# Altium footprint library Elettronica FM.PcbLib: 387 footprints (part 23 of 25)
Each footprint in its own frame and in the unit in brackets; x right, y up, seen from the top. Pads: shape width x height; smd on the part's side, far side on the other; paste and mask are expansions set on the pad; w line width, h text height; cw(c..) or ccw(c..) is an arc to the next point about the centre after c.
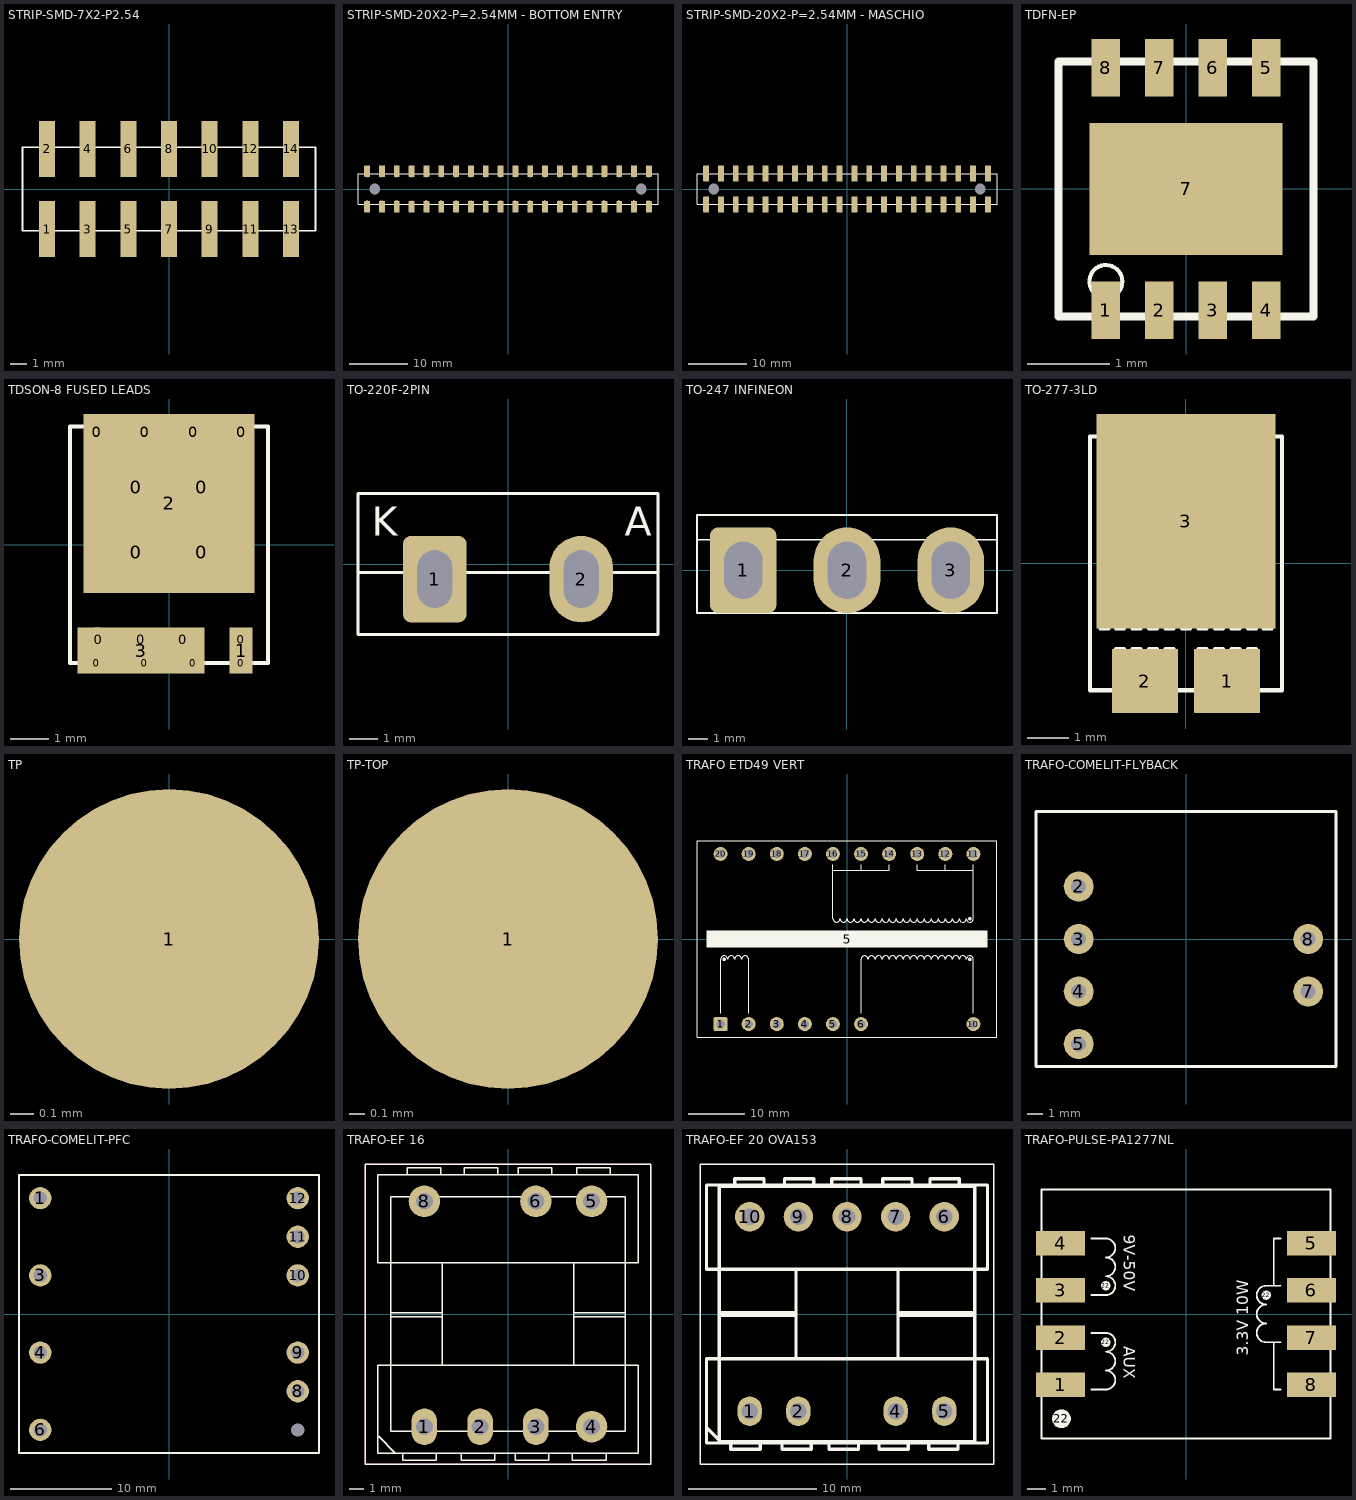
[diagram p22: the footprints below, top view; thin cyan lines are the x and y axes]

## STRIP-SMD-7X2-P2.54 [mm]
pads (14):
  rect 1x3.5 smd: 1(-7.62,-2.5) 2(-7.62,2.5) 3(-5.08,-2.5) 4(-5.08,2.5) 5(-2.54,-2.5) 6(-2.54,2.5) 7(0,-2.5) 8(0,2.5) 9(2.54,-2.5) 10(2.54,2.5) 11(5.08,-2.5) 12(5.08,2.5) 13(7.62,-2.5) 14(7.62,2.5)
Top Overlay:
  lines w0.1: -9.15,-2.6 9.15,-2.6 9.15,2.6 -9.15,2.6 -9.15,-2.6
3D body "Samtec-TSM-103-02-T-DV.step": height 11.94, standoff 0, extent -8.9,-3.683 -1.28,3.683
3D body "Samtec-TSM-103-02-T-DV.step": height 11.94, standoff 0, extent -3.82,-3.683 3.8,3.683
3D body "Samtec-TSM-103-02-T-DV.step": height 11.94, standoff 0, extent 1.26,-3.683 8.88,3.683

## STRIP-SMD-20X2-P=2.54MM - BOTTOM ENTRY [mm]
height 16.6
pads (42):
  round 0 hole 1.8 unplated: 0(-22.86,0) 0(22.86,0)
  rrect25% 1x2 smd: 1(-24.13,-3.05) 2(-24.13,3.05) 3(-21.59,-3.05) 4(-21.59,3.05) 5(-19.05,-3.05) 6(-19.05,3.05) 7(-16.51,-3.05) 8(-16.51,3.05) 9(-13.97,-3.05) 10(-13.97,3.05) 11(-11.43,-3.05) 12(-11.43,3.05) 13(-8.89,-3.05) 14(-8.89,3.05) 15(-6.35,-3.05) 16(-6.35,3.05) 17(-3.81,-3.05) 18(-3.81,3.05) 19(-1.27,-3.05) 20(-1.27,3.05) 21(1.27,-3.05) 22(1.27,3.05) 23(3.81,-3.05) 24(3.81,3.05) 25(6.35,-3.05) 26(6.35,3.05) 27(8.89,-3.05) 28(8.89,3.05) 29(11.43,-3.05) 30(11.43,3.05) 31(13.97,-3.05) 32(13.97,3.05) 33(16.51,-3.05) 34(16.51,3.05) 35(19.05,-3.05) 36(19.05,3.05) 37(21.59,-3.05) 38(21.59,3.05) 39(24.13,-3.05) 40(24.13,3.05)
Top Overlay:
  lines w0.1: -25.7,-2.65 25.7,-2.65 25.7,2.65 -25.7,2.65 -25.7,-2.65
  text "7" at -16.675,-1.95 h0.3
  text "8" at -16.675,2.15 h0.3
  text "6" at -19.215,2.15 h0.3
  text "4" at -21.765,2.15 h0.3
  text "2" at -24.29,2.15 h0.3
  text "5" at -19.215,-1.95 h0.3
  text "3" at -21.765,-1.95 h0.3
  text "1" at -24.29,-1.95 h0.3
  text "9" at -14.135,-1.95 h0.3
  text "11" at -11.6,-1.95 h0.3
  text "13" at -9.06,-1.95 h0.3
  text "15" at -6.52,-1.95 h0.3
  text "17" at -3.98,-1.95 h0.3
  text "19" at -1.44,-1.95 h0.3
  text "21" at 1.1,-1.95 h0.3
  text "23" at 3.64,-1.95 h0.3
  text "25" at 6.18,-1.95 h0.3
  text "27" at 8.72,-1.95 h0.3
  text "29" at 11.26,-1.95 h0.3
  text "31" at 13.8,-1.95 h0.3
  text "33" at 16.34,-1.95 h0.3
  text "35" at 18.88,-1.95 h0.3
  text "37" at 21.42,-1.95 h0.3
  text "39" at 23.96,-1.95 h0.3
  text "10" at -14.135,2.4 h0.3
  text "12" at -11.595,2.4 h0.3
  text "14" at -9.055,2.4 h0.3
  text "22" at 1.105,2.45 h0.3
  text "20" at -1.435,2.45 h0.3
  text "18" at -3.975,2.4 h0.3
  text "16" at -6.515,2.4 h0.3
  text "30" at 11.265,2.45 h0.3
  text "28" at 8.725,2.45 h0.3
  text "26" at 6.185,2.45 h0.3
  text "24" at 3.645,2.45 h0.3
  text "38" at 21.425,2.45 h0.3
  text "36" at 18.885,2.45 h0.3
  text "34" at 16.345,2.45 h0.3
  text "32" at 13.805,2.45 h0.3
  text "40" at 23.965,2.45 h0.3
3D body: height 7.4, standoff 0, extent -25.7,-2.65 25.7,2.65

## STRIP-SMD-20X2-P=2.54MM - MASCHIO [mm]
height 16.6
pads (42):
  round 0 hole 1.8 unplated: 0(-22.86,0) 0(22.86,0)
  rrect25% 1x2.8 smd: 1(-24.13,-2.65) 2(-24.13,2.65) 3(-21.59,-2.65) 4(-21.59,2.65) 5(-19.05,-2.65) 6(-19.05,2.65) 7(-16.51,-2.65) 8(-16.51,2.65) 9(-13.97,-2.65) 10(-13.97,2.65) 11(-11.43,-2.65) 12(-11.43,2.65) 13(-8.89,-2.65) 14(-8.89,2.65) 15(-6.35,-2.65) 16(-6.35,2.65) 17(-3.81,-2.65) 18(-3.81,2.65) 19(-1.27,-2.65) 20(-1.27,2.65) 21(1.27,-2.65) 22(1.27,2.65) 23(3.81,-2.65) 24(3.81,2.65) 25(6.35,-2.65) 26(6.35,2.65) 27(8.89,-2.65) 28(8.89,2.65) 29(11.43,-2.65) 30(11.43,2.65) 31(13.97,-2.65) 32(13.97,2.65) 33(16.51,-2.65) 34(16.51,2.65) 35(19.05,-2.65) 36(19.05,2.65) 37(21.59,-2.65) 38(21.59,2.65) 39(24.13,-2.65) 40(24.13,2.65)
Top Overlay:
  lines w0.1: -25.7,-2.65 -25.7,2.65 25.7,2.65 25.7,-2.65 -25.7,-2.65
  text "40" at 23.965,2.45 h0.3
  text "32" at 13.805,2.45 h0.3
  text "34" at 16.345,2.45 h0.3
  text "36" at 18.885,2.45 h0.3
  text "38" at 21.425,2.45 h0.3
  text "24" at 3.645,2.45 h0.3
  text "26" at 6.185,2.45 h0.3
  text "28" at 8.725,2.45 h0.3
  text "30" at 11.265,2.45 h0.3
  text "16" at -6.515,2.4 h0.3
  text "18" at -3.975,2.4 h0.3
  text "20" at -1.435,2.45 h0.3
  text "22" at 1.105,2.45 h0.3
  text "14" at -9.055,2.4 h0.3
  text "12" at -11.595,2.4 h0.3
  text "10" at -14.135,2.4 h0.3
  text "39" at 23.96,-1.95 h0.3
  text "37" at 21.42,-1.95 h0.3
  text "35" at 18.88,-1.95 h0.3
  text "33" at 16.34,-1.95 h0.3
  text "31" at 13.8,-1.95 h0.3
  text "29" at 11.26,-1.95 h0.3
  text "27" at 8.72,-1.95 h0.3
  text "25" at 6.18,-1.95 h0.3
  text "23" at 3.64,-1.95 h0.3
  text "21" at 1.1,-1.95 h0.3
  text "19" at -1.44,-1.95 h0.3
  text "17" at -3.98,-1.95 h0.3
  text "15" at -6.52,-1.95 h0.3
  text "13" at -9.06,-1.95 h0.3
  text "11" at -11.6,-1.95 h0.3
  text "9" at -14.135,-1.95 h0.3
  text "1" at -24.29,-1.95 h0.3
  text "3" at -21.765,-1.95 h0.3
  text "5" at -19.215,-1.95 h0.3
  text "2" at -24.29,2.15 h0.3
  text "4" at -21.765,2.15 h0.3
  text "6" at -19.215,2.15 h0.3
  text "8" at -16.675,2.15 h0.3
  text "7" at -16.675,-1.95 h0.3
3D body: height 7.4, standoff 0, extent -25.7,-2.65 25.7,2.65

## TDFN-EP [mm]
height 1.9
pads (9):
  rect 0.35x0.7 smd paste-0.05 mask+0.1: 1(-0.975,-1.475) 2(-0.325,-1.475) 3(0.325,-1.475) 4(0.975,-1.475) 5(0.975,1.475) 6(0.325,1.475) 7(-0.325,1.475) 8(-0.975,1.475)
  rect 2.35x1.6 smd paste-0.05 mask+0.1: 7(0,0)
Top Overlay:
  circle w0.05: c-0.975,-1.125 r0.2
  lines w0.1: -1.55,-1.55 -1.55,1.55 1.55,1.55 1.55,-1.55 -1.55,-1.55
3D body: height 0.8, standoff 0, extent -1.55,-1.55 1.55,1.55

## TDSON-8 FUSED LEADS [mm]
pads (19):
  rect 0.4x0.35 on Top Paste mask+0.1: 0(-1.875,-3.075) 0(-0.625,-3.075) 0(0.625,-3.075) 0(1.875,-3.075)
  rect 0.5x0.75 on Top Paste mask+0.1: 0(-1.875,2.925) 0(-0.625,2.925) 0(0.625,2.925) 0(1.875,2.925)
  rect 0.9x0.45 on Top Paste mask+0.1: 0(-1.825,-2.475) 0(-0.725,-2.475) 0(0.375,-2.475)
  rect 1.5x1.5 on Top Paste mask+0.1: 0(-0.85,-0.2) 0(-0.85,1.5) 0(0.85,-0.2) 0(0.85,1.5)
  rect 0.4x0.45 on Top Paste mask+0.1: 0(1.875,-2.475)
  rect 0.6x1.2 smd paste-50 mask-50: 1(1.875,-2.75)
  rect 4.45x4.65 smd paste-50 mask-50: 2(0,1.075)
  rect 3.3x1.2 smd paste-50 mask-50: 3(-0.725,-2.75)
Top Overlay:
  circle w0.1: c-1.875,-2.5 r0.3
  lines w0.1: -2.575,-3.075 -2.575,3.075 2.575,3.075 2.575,-3.075 -2.575,-3.075
Top Solder:
  region: 1.625,-2.2 1.625,-3.3 2.125,-3.3 2.125,-2.2
  region: -2.325,-2.2 -2.325,-2.8 -2.125,-2.8 -2.125,-3.3 -1.625,-3.3 -1.625,-2.8 -0.875,-2.8 -0.875,-3.3 -0.375,-3.3 -0.375,-2.8 0.375,-2.8 0.375,-3.3 0.875,-3.3 0.875,-2.2
  region: -2.175,3.35 -2.175,-1.2 2.175,-1.2 2.175,3.35 1.575,3.35 1.575,2.55 0.925,2.55 0.925,3.35 0.325,3.35 0.325,2.55 -0.325,2.55 -0.325,3.35 -0.925,3.35 -0.925,2.55 -1.575,2.55 -1.575,3.35
3D body: height 1.1, standoff 0, extent -2.575,-3.075 2.575,3.075

## TO-220F-2PIN [mm]
pads (2):
  rrect25% 2.2x3 hole 1.2 slot 2 at 90 deg: 1(-2.538,-0.525)
  oval 2.2x3 hole 1.2 slot 2 at 90 deg: 2(2.538,-0.525)
Top Overlay:
  lines w0.1: -5.2,-0.3 5.2,-0.3 ; -5.2,-2.45 -5.2,2.45 5.2,2.45 5.2,-2.45 -5.2,-2.45
  text "A" at 4.05,0.975 h1
  text "K" at -4.725,0.975 h1
3D body: height 3.23, standoff 0, extent 1.79,-0.81 3.29,-0.21
3D body: height 3.23, standoff 0, extent -3.29,-0.81 -1.79,-0.21
3D body: height 9.2, standoff 3.23, extent -5.2,-2.45 5.2,-0.29
3D body: height 16.1, standoff 3.23, extent -5.2,-0.29 5.2,2.45
3D body: height 0, standoff -4.1, extent -2.99,-0.81 -2.09,-0.21
3D body: height 0, standoff -4.1, extent 2.09,-0.81 2.99,-0.21
3D body: height 14.35, standoff 11.05, extent -1.649,-0.325 1.649,2.475

## TO-247 INFINEON [mm]
pads (3):
  rrect25% 3.5x4.5 hole 2 slot 3 at 90 deg: 1(-5.45,0)
  oval 3.5x4.5 hole 2 slot 3 at 90 deg: 2(0,0) 3(5.45,0)
Top Overlay:
  lines w0.1: -7.875,1.6 7.875,1.6 ; -7.875,-2.25 7.875,-2.25 7.875,2.9 -7.875,2.9 -7.875,-2.25
3D body: height 4.3, standoff 0, extent -6.65,-0.9 -4.25,-0.1
3D body: height 8, standoff -4, extent -6.15,-0.9 -4.75,-0.1
3D body: height 8, standoff -4, extent 4.75,-0.9 6.15,-0.1
3D body: height 4.3, standoff 0, extent 4.25,-0.9 6.65,-0.1
3D body: height 8, standoff -4, extent -6.15,-0.9 -4.75,-0.1
3D body: height 4.3, standoff 0, extent -1.7,-0.9 1.7,-0.1
3D body: height 20.32, standoff 16.67, extent -1.825,-2.3 1.825,2.9
3D body: height 24.45, standoff 4.3, extent -7.875,-2.25 7.875,2.9
3D body: height 8, standoff -4, extent -0.7,-0.9 0.7,-0.1

## TO-277-3LD [mm]
height 1.9
pads (3):
  rect 1.6x1.55 smd paste-0.05 mask+0.075: 1(1,-2.85) 2(-1,-2.85)
  rect 4.35x5.2 smd paste-0.05 mask+0.075: 3(0,1.025)
Top Overlay:
  lines w0.1: -2.075,-1.375 -2.075,-1.575 -1.875,-1.575 ; -2.075,-1.175 -2.075,-0.975 ; -2.075,-0.775 -2.075,-0.575 ; -2.075,-0.375 -2.075,-0.175 ; -2.075,0.025 -2.075,0.225 ; -2.075,0.425 -2.075,0.625 ; -2.075,0.825 -2.075,1.025 ; -2.075,1.225 -2.075,1.425 ; -2.075,1.625 -2.075,1.825 ; -2.075,2.025 -2.075,2.225 ; -2.075,2.425 -2.075,2.625 ; -2.075,2.825 -2.075,3.025 ; -1.7,-2.875 -1.7,-3.075 -1.7,-3.325 -0.3,-3.325 -0.3,-3.075 -0.3,-2.875 ; -1.7,-2.675 -1.7,-2.475 ; -1.7,-2.275 -1.7,-2.075 -1.5,-2.075 ; -1.7,-1.575 -1.5,-1.575 ; -1.3,-2.075 -1.1,-2.075 ; -1.3,-1.575 -1.1,-1.575 ; -1.125,3.075 -1.125,3.325 1.125,3.325 1.125,3.075 ; -0.9,-2.075 -0.7,-2.075 ; -0.9,-1.575 -0.7,-1.575 ; -0.5,-2.075 -0.3,-2.075 -0.3,-2.275 ; -0.5,-1.575 -0.3,-1.575 ; -0.3,-2.675 -0.3,-2.475 ; -0.1,-1.575 0.1,-1.575 ; 0.3,-2.875 0.3,-3.075 0.3,-3.325 1.7,-3.325 1.7,-3.075 1.7,-2.875 ; 0.3,-2.675 0.3,-2.475 ; 0.3,-2.275 0.3,-2.075 0.5,-2.075 ; 0.3,-1.575 0.5,-1.575 ; 0.7,-2.075 0.9,-2.075 ; 0.7,-1.575 0.9,-1.575 ; 1.1,-2.075 1.3,-2.075 ; 1.1,-1.575 1.3,-1.575 ; 1.5,-2.075 1.7,-2.075 1.7,-2.275 ; 1.5,-1.575 1.7,-1.575 ; 1.7,-2.675 1.7,-2.475 ; 1.875,-1.575 2.075,-1.575 2.075,-1.375 ; 2.075,-1.175 2.075,-0.975 ; 2.075,-0.775 2.075,-0.575 ; 2.075,-0.375 2.075,-0.175 ; 2.075,0.025 2.075,0.225 ; 2.075,0.425 2.075,0.625 ; 2.075,0.825 2.075,1.025 ; 2.075,1.225 2.075,1.425 ; 2.075,1.625 2.075,1.825 ; 2.075,2.025 2.075,2.225 ; 2.075,2.425 2.075,2.625 ; 2.075,2.825 2.075,3.025 ; -2.325,-3.075 -2.325,3.075 2.325,3.075 2.325,-3.075 -2.325,-3.075

## TP [mm]
pads (1):
  round 1.3 smd paste-1.27: 1(0,0)

## TP-TOP [mm]
pads (1):
  round 2 smd paste-1.27: 1(0,0)

## TRAFO ETD49 VERT [mm]
pads (21):
  rrect25% 2.5x2.5 hole 1.5: 1(-22.5,-15.15)
  round 2.5 hole 1.5: 2(-17.5,-15.15) 3(-12.5,-15.15) 4(-7.5,-15.15) 5(-2.5,-15.15) 6(2.5,-15.15) 10(22.5,-15.15) 11(22.5,15.15) 12(17.5,15.15) 13(12.5,15.15) 14(7.5,15.15) 15(2.5,15.15) 16(-2.5,15.15) 17(-7.5,15.15) 18(-12.5,15.15) 19(-17.5,15.15) 20(-22.5,15.15)
  round 0.625 on Top Overlay mask+0.1: 4(-21.875,-3.625) 4(21.875,-3.625) 4(21.875,3.625)
  rect 50x3 on Top Overlay mask+0.1: 5(0,0)
Top Overlay:
  lines w0.1: -26.7,-17.5 -26.7,17.5 26.7,17.5 26.7,-17.5 -26.7,-17.5
  lines w0.2: -22.5,-13.25 -22.5,-3.625 cw(c-21.875,-3.625) -21.25,-3.625 cw(c-20.625,-3.625) -20,-3.625 cw(c-19.375,-3.625) -18.75,-3.625 cw(c-18.125,-3.625) -17.5,-3.625 -17.5,-13.25 ; -2.5,13.25 -2.5,12.25 2.5,12.25 ; -2.5,13.25 -2.5,3.625 ccw(c-1.875,3.625) -1.25,3.625 ccw(c-0.625,3.625) 0,3.625 ccw(c0.625,3.625) 1.25,3.625 ccw(c1.875,3.625) 2.5,3.625 ccw(c3.125,3.625) 3.75,3.625 ccw(c4.375,3.625) 5,3.625 ccw(c5.625,3.625) 6.25,3.625 ccw(c6.875,3.625) 7.5,3.625 ccw(c8.125,3.625) 8.75,3.625 ccw(c9.375,3.625) 10,3.625 ccw(c10.625,3.625) 11.25,3.625 ccw(c11.875,3.625) 12.5,3.625 ccw(c13.125,3.625) 13.75,3.625 ccw(c14.375,3.625) 15,3.625 ccw(c15.625,3.625) 16.25,3.625 ccw(c16.875,3.625) 17.5,3.625 ccw(c18.125,3.625) 18.75,3.625 ccw(c19.375,3.625) 20,3.625 ccw(c20.625,3.625) 21.25,3.625 ccw(c21.875,3.625) 22.5,3.625 22.5,13.25 22.5,12.25 17.5,12.25 ; 2.5,-13.25 2.5,-3.625 cw(c3.125,-3.625) 3.75,-3.625 cw(c4.375,-3.625) 5,-3.625 cw(c5.625,-3.625) 6.25,-3.625 cw(c6.875,-3.625) 7.5,-3.625 cw(c8.125,-3.625) 8.75,-3.625 cw(c9.375,-3.625) 10,-3.625 cw(c10.625,-3.625) 11.25,-3.625 cw(c11.875,-3.625) 12.5,-3.625 cw(c13.125,-3.625) 13.75,-3.625 cw(c14.375,-3.625) 15,-3.625 cw(c15.625,-3.625) 16.25,-3.625 cw(c16.875,-3.625) 17.5,-3.625 cw(c18.125,-3.625) 18.75,-3.625 cw(c19.375,-3.625) 20,-3.625 cw(c20.625,-3.625) 21.25,-3.625 cw(c21.875,-3.625) 22.5,-3.625 22.5,-13.25 ; 2.5,13.25 2.5,12.25 ; 7.5,13.25 7.5,12.25 2.5,12.25 ; 12.5,13.25 12.5,12.25 17.5,12.25 ; 17.5,13.25 17.5,12.25
3D body: height 55.4, standoff 0, extent -26.7,-17.5 26.7,17.5

## TRAFO-COMELIT-FLYBACK [mm]
height 4.8
pads (6):
  round 2 hole 1: 2(-7.15,3.5) 3(-7.15,0) 4(-7.15,-3.5) 5(-7.15,-7) 7(8.15,-3.5) 8(8.15,0)
Top Overlay:
  lines w0.2: -10,-8.5 -10,8.5 10,8.5 10,-8.5 -10,-8.5
3D body: height 10.5, standoff 0, extent -10,-8.5 10,8.5

## TRAFO-COMELIT-PFC [mm] "PQ26/25 Coil Former Comelit, Plated"
height 29
pads (10):
  round 2.2 hole 1.3: 1(-12.7,11.43) 3(-12.7,3.81) 4(-12.7,-3.81) 6(-12.7,-11.43) 8(12.7,-7.62) 9(12.7,-3.81) 10(12.7,3.81) 11(12.7,7.62) 12(12.7,11.43)
  round 0 hole 1.3 unplated: 7(12.7,-11.43)
Top Overlay:
  lines w0.2: -14.8,-13.7 -14.8,13.7 14.8,13.7 14.8,-13.7 -14.8,-13.7
3D body "TRANS PQ2625.step": height 25.3, standoff -2.4, extent -14.06,-13.5 14.06,13.5

## TRAFO-EF 16 [mm]
pads (8):
  oval 1.75x2.5 hole 1.15: 1(-5.715,-7.7) 2(-1.905,-7.7) 3(1.905,-7.7)
  round 2.15 hole 1.15: 4(5.715,-7.7) 5(5.715,7.7) 6(1.905,7.7) 8(-5.715,7.7)
  round 0 all layers, no hole mask+0: 7(-1.905,7.62)
Top Overlay:
  lines w0.1: -8.843,-8.357 -7.7,-9.5 ; -8,-0.2 -4.5,-0.2 ; -8,0.1 -4.5,0.1 ; -7.2,-9.5 -7.2,-10 -4.9,-10 -4.9,-9.5 ; -6.9,9.5 -6.9,10 -4.6,10 -4.6,9.5 ; -4.5,-3.5 -4.5,3.499 ; -3.2,-9.5 -3.2,-10 -0.9,-10 -0.9,-9.5 ; -3,9.5 -3,10 -0.7,10 -0.7,9.5 ; 0.5,-9.5 0.5,-10 2.8,-10 2.8,-9.5 ; 0.7,9.5 0.7,10 3,10 3,9.5 ; 4.4,-9.5 4.4,-10 6.7,-10 6.7,-9.5 ; 4.5,-3.5 4.5,3.499 ; 4.5,-0.2 8,-0.2 ; 4.5,0.1 8,0.1 ; 4.7,9.5 4.7,10 7,10 7,9.5 ; -8.9,3.505 -8.9,3.505 ; -8.9,3.505 8.9,3.498 8.9,9.5 -8.9,9.5 -8.9,3.505 ; -8.9,-9.5 -8.9,-3.5 8.9,-3.5 8.9,-9.5 -8.9,-9.5 ; -8,-8 -8,8 8,8 8,-8 -8,-8
Top Overlay keep-out:
  lines w0.1: -9.75,-10.25 -9.75,10.25 9.75,10.25 9.75,-10.25 -9.75,-10.25

## TRAFO-EF 20 OVA153 [mm]
pads (9):
  oval 1.9x2.3 hole 1.3: 1(-7.62,-7.62) 2(-3.81,-7.62) 4(3.81,-7.62) 5(7.62,-7.62)
  round 2.3 hole 1.3: 6(7.62,7.62) 7(3.81,7.62) 8(0,7.62) 9(-3.81,7.62) 10(-7.62,7.62)
Top Overlay:
  lines w0.1: -11.5,-11.75 -11.5,11.75 11.5,11.75 11.5,-11.75 -11.5,-11.75
  lines w0.254: -11,3.5 11,3.5 ; -11,3.505 -11,10.1 11,10.1 11,3.498 ; -10.943,-8.957 -9.8,-10.1 ; -10,-0.1 -4,-0.1 ; -10,0.1 -4,0.1 ; -9.1,-10.1 -9.1,-10.6 -6.8,-10.6 -6.8,-10.1 ; -8.8,10.1 -8.8,10.6 -6.5,10.6 -6.5,10.1 ; -5.1,-10.1 -5.1,-10.6 -2.8,-10.6 -2.8,-10.1 ; -4.9,10.1 -4.9,10.6 -2.6,10.6 -2.6,10.1 ; -4,-3.5 -4,3.5 ; -1.4,-10.1 -1.4,-10.6 0.9,-10.6 0.9,-10.1 ; -1.2,10.1 -1.2,10.6 1.1,10.6 1.1,10.1 ; 2.5,-10.1 2.5,-10.6 4.8,-10.6 4.8,-10.1 ; 2.8,10.1 2.8,10.6 5.1,10.6 5.1,10.1 ; 4,-3.5 4,3.5 ; 4,-0.1 10,-0.1 ; 4,0.1 10,0.1 ; 6.4,-10.1 6.4,-10.6 8.7,-10.6 8.7,-10.1 ; 6.5,10.1 6.5,10.6 8.8,10.6 8.8,10.1 ; -11,-10.1 11,-10.1 11,-3.5 -11,-3.5 -11,-10.1 ; -10,-10 10,-10 10,10 -10,10 -10,-10
3D body: height 18, standoff 0, extent -11.5,-11.75 11.5,11.75

## TRAFO-PULSE-PA1277NL [mm]
pads (12):
  rect 2.6x1.3 smd mask+0.1: 1(-6.65,-3.75) 2(-6.65,-1.25) 3(-6.65,1.25) 4(-6.65,3.75) 5(6.65,3.75) 6(6.65,1.25) 7(6.65,-1.25) 8(6.65,-3.75)
  round 1 on Top Overlay paste+0 mask+0.05: 22(-6.6,-5.55)
  round 0.5 on Top Overlay paste+0 mask+0.05: 22(-4.25,-1.5) 22(-4.25,1.5) 22(4.25,1)
Top Overlay:
  lines w0.1: -5,-4 -4.25,-4 ccw(c-4.25,-3.5) -4.25,-3 ccw(c-4.25,-2.5) -4.25,-2 ccw(c-4.25,-1.5) -4.25,-1 -5,-1 ; -5,1 -4.25,1 ccw(c-4.25,1.5) -4.25,2 ccw(c-4.25,2.5) -4.25,3 ccw(c-4.25,3.5) -4.25,4 -5,4 ; 5,-4 4.65,-4 4.65,-1.5 ; 5,-1.5 4.65,-1.5 ; 5,1.5 4.65,1.5 ; 5,4 4.65,4 4.65,1.5 ; 4.65,-1.5 4.25,-1.5 cw(c4.25,-1) 4.25,-0.5 cw(c4.25,0) 4.25,0.5 cw(c4.25,1) 4.25,1.5 4.65,1.5 ; -7.65,-6.6 7.65,-6.6 7.65,6.6 -7.65,6.6 -7.65,-6.6
  text "3.3V 10W" at 3.3,-2.2 h0.6
  text "9V-50V" at -3.3,4.2 h0.6
  text "AUX" at -3.3,-1.7 h0.6
3D body: height 11.45, standoff 0, extent -7.65,-6.6 7.65,6.6